# Altium footprint library Derogarian_Library.PcbLib: 99 footprints (part 6 of 7)
Each footprint in its own frame and in the unit in brackets; x right, y up, seen from the top. Pads: shape width x height; smd on the part's side, far side on the other; paste and mask are expansions set on the pad; w line width, h text height; cw(c..) or ccw(c..) is an arc to the next point about the centre after c.
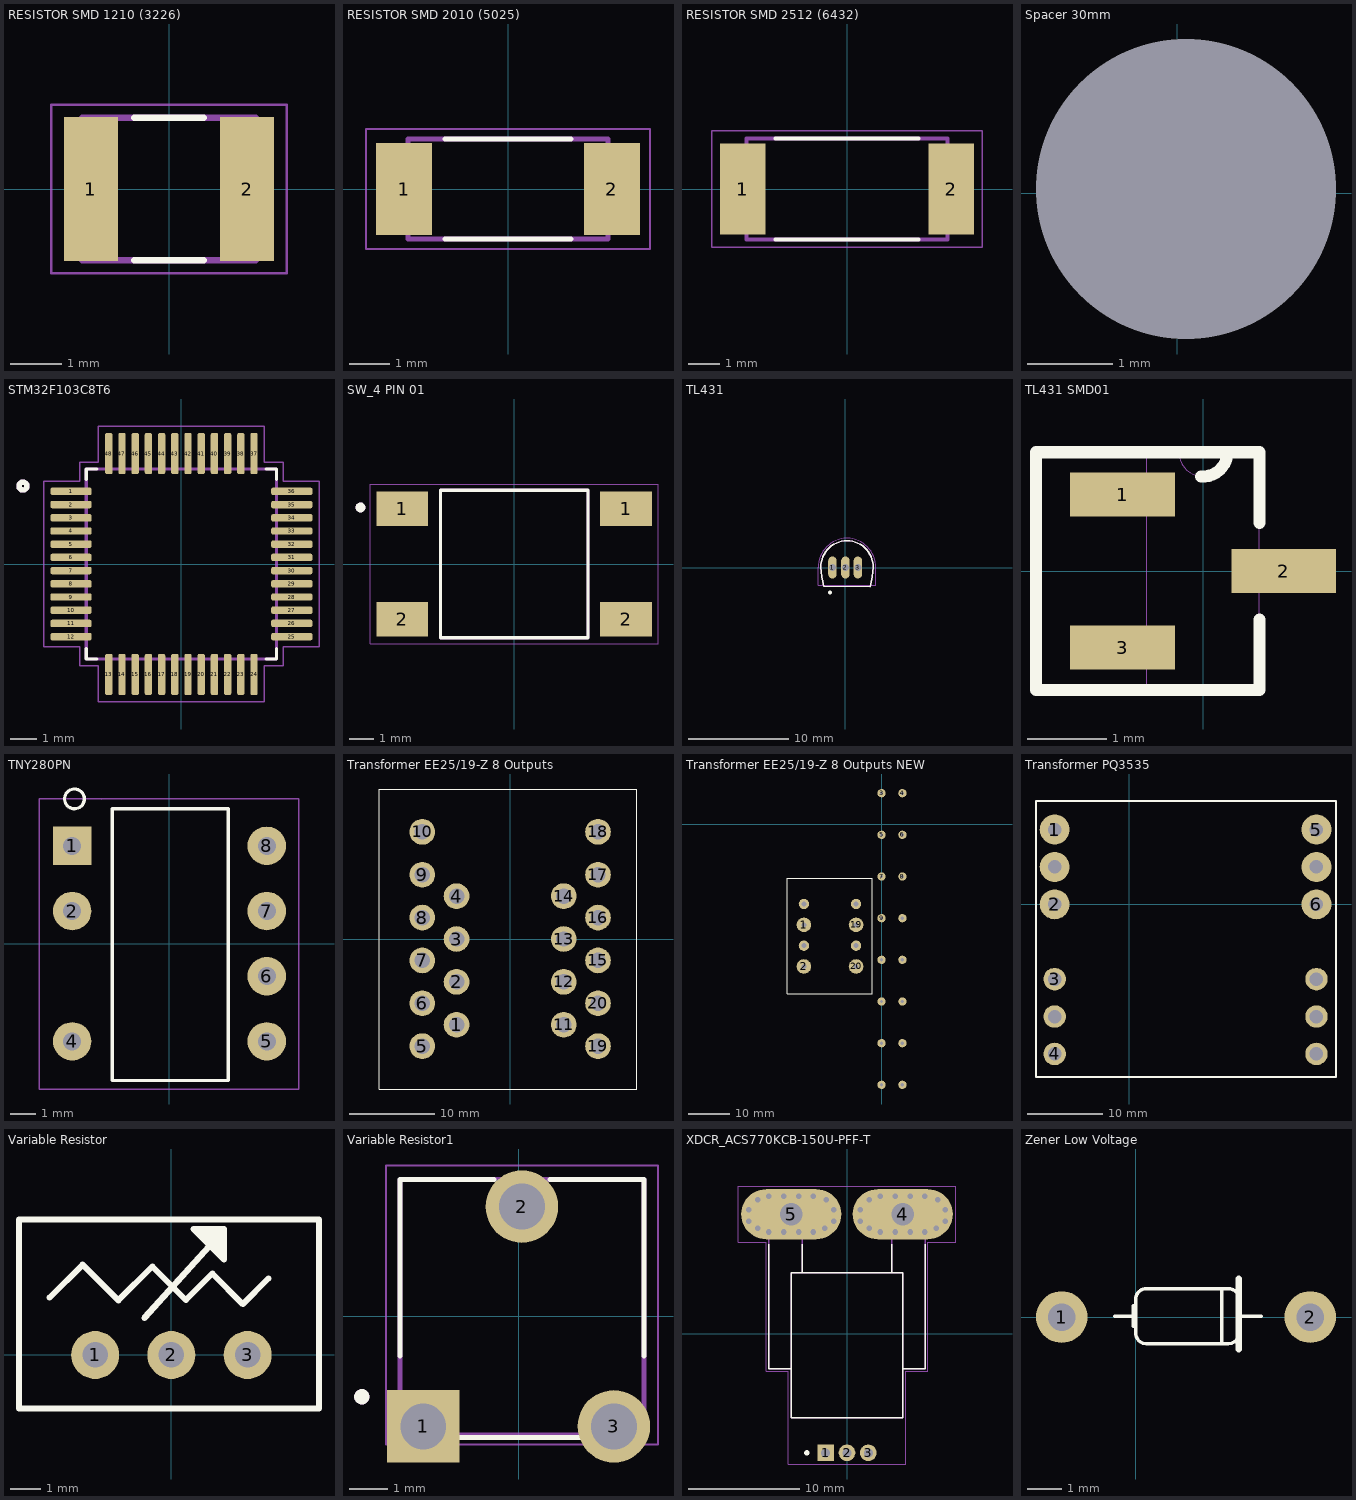
[diagram p5: the footprints below, top view; thin cyan lines are the x and y axes]

## RESISTOR SMD 1210 (3226) [mm] "SMD 1210"
pads (2):
  rect 1.06x2.82 smd: 1(-1.528,0) 2(1.528,0)
Top Overlay:
  lines w0.127: -0.68,-1.4 0.68,-1.4 ; -0.68,1.4 0.68,1.4
Mechanical 13:
  lines w0.127: -1.7,-1.4 -1.7,1.4 1.7,1.4 1.7,-1.4 -1.7,-1.4
Mechanical 15:
  lines w0.05: -2.308,-1.65 -2.308,1.65 2.308,1.65 2.308,-1.65 -2.308,-1.65
3D body "User Library-RESC3225X06N.STEP": height 0.55, standoff 0, extent -1.625,-1.199 1.575,1.301

## RESISTOR SMD 2010 (5025) [mm] "SMD 2010"
pads (2):
  rect 1.4x2.3 smd: 1(-2.6,0) 2(2.6,0)
Top Overlay:
  lines w0.127: -1.58,-1.25 1.58,-1.25 ; -1.58,1.25 1.58,1.25
Mechanical 13:
  lines w0.127: -2.5,-1.25 2.5,-1.25 2.5,1.25 -2.5,1.25 -2.5,-1.25
Mechanical 15:
  lines w0.05: -3.55,-1.5 3.55,-1.5 3.55,1.5 -3.55,1.5 -3.55,-1.5
3D body "User Library-R2010-2.STEP": height 0.6, standoff 0, extent -2.449,-1.245 2.551,1.255

## RESISTOR SMD 2512 (6432) [mm] "SMD 2512"
pads (2):
  rect 1.45x2.9 smd: 1(-3.325,0) 2(3.325,0)
Top Overlay:
  lines w0.127: -2.28,-1.6 2.28,-1.6 ; -2.28,1.6 2.28,1.6
Mechanical 13:
  lines w0.127: -3.2,-1.6 3.2,-1.6 3.2,1.6 -3.2,1.6 -3.2,-1.6
Mechanical 15:
  lines w0.05: -4.3,-1.85 4.3,-1.85 4.3,1.85 -4.3,1.85 -4.3,-1.85
3D body "User Library-RESC6432X06.STEP": height 0.6, standoff 0, extent -3.225,-1.6 3.175,1.6

## Spacer 30mm [mil]
pads (1):
  round 0 hole 137.8: ""(4,2)
3D body "DSMM3050030_BUFAB.step": height 393.7, standoff -1181.1, extent -98.85,-125 98,102.3

## STM32F103C8T6 [mm] "ARM® Cortex®-M3 STM32F1 Microcontroller IC 32-Bit 72MHz 64KB"
pads (48):
  rrect50% 1.56x0.28 smd: 1(-4.18,2.75) 2(-4.18,2.25) 3(-4.18,1.75) 4(-4.18,1.25) 5(-4.18,0.75) 6(-4.18,0.25) 7(-4.18,-0.25) 8(-4.18,-0.75) 9(-4.18,-1.25) 10(-4.18,-1.75) 11(-4.18,-2.25) 12(-4.18,-2.75) 25(4.18,-2.75) 26(4.18,-2.25) 27(4.18,-1.75) 28(4.18,-1.25) 29(4.18,-0.75) 30(4.18,-0.25) 31(4.18,0.25) 32(4.18,0.75) 33(4.18,1.25) 34(4.18,1.75) 35(4.18,2.25) 36(4.18,2.75)
  rrect50% 0.28x1.56 smd: 13(-2.75,-4.18) 14(-2.25,-4.18) 15(-1.75,-4.18) 16(-1.25,-4.18) 17(-0.75,-4.18) 18(-0.25,-4.18) 19(0.25,-4.18) 20(0.75,-4.18) 21(1.25,-4.18) 22(1.75,-4.18) 23(2.25,-4.18) 24(2.75,-4.18) 37(2.75,4.18) 38(2.25,4.18) 39(1.75,4.18) 40(1.25,4.18) 41(0.75,4.18) 42(0.25,4.18) 43(-0.25,4.18) 44(-0.75,4.18) 45(-1.25,4.18) 46(-1.75,4.18) 47(-2.25,4.18) 48(-2.75,4.18)
Top Overlay:
  circle w0.2: c-6,2.95 r0.15
  lines w0.127: -3.6,-3.21 -3.6,-3.6 -3.21,-3.6 ; -3.6,3.21 -3.6,3.6 -3.21,3.6 ; 3.21,-3.6 3.6,-3.6 3.6,-3.21 ; 3.21,3.6 3.6,3.6 3.6,3.21
Mechanical 13:
  circle w0.2: c-6,2.95 r0.15
  lines w0.127: -3.6,-3.6 -3.6,3.6 3.6,3.6 3.6,-3.6 -3.6,-3.6
Mechanical 15:
  lines w0.05: -5.21,-3.14 -5.21,3.14 -3.85,3.14 -3.85,3.85 -3.14,3.85 -3.14,5.21 3.14,5.21 3.14,3.85 3.85,3.85 3.85,3.14 5.21,3.14 5.21,-3.14 3.85,-3.14 3.85,-3.85 3.14,-3.85 3.14,-5.21 -3.14,-5.21 -3.14,-3.85 -3.85,-3.85 -3.85,-3.14 -5.21,-3.14
3D body "User Library-LQFP50P900X900X160.STEP": height 1.6, standoff 0, extent -4.5,-4.5 4.5,4.5

## SW_4 PIN 01 [mm]
pads (4):
  rect 2.1x1.4 smd: 1(-4.55,2.25) 1(4.55,2.25) 2(-4.55,-2.25) 2(4.55,-2.25)
Top Overlay:
  circle w0.2: c-6.25,2.3 r0.1
  lines w0.127: -3,-3 -3,3 3,3 3,-3 -3,-3
Mechanical 13:
  circle w0.2: c-6.25,2.3 r0.1
  lines w0.127: -3,-3 3,-3 3,3 -3,3 -3,-3
Mechanical 15:
  lines w0.05: -5.85,-3.25 5.85,-3.25 5.85,3.25 -5.85,3.25 -5.85,-3.25
3D body "4-1437565-2.stp": height 5, standoff -0.07, extent -5.178,-3.15 4.822,2.85

## TL431 [mm] "Voltage Reference"
pads (3):
  oval 0.85x2.2 hole 0.7: 1(-1.27,0) 2(0.025,0) 3(1.27,0)
Top Overlay:
  circle w0.2: c-1.524,-2.489 r0.1
  lines w0.127: -2.428,0.043 ccw(c6.356,0.349) -2.152,-1.859 ; -2.427,-0.004 cw(c0.21,0.042) 0.164,2.679 ; -2.134,-1.892 2.489,-1.905 ; 0.191,2.679 cw(c0.145,0.042) 2.783,-0.004 ; 2.497,-1.9 ccw(c-6,0.349) 2.784,0.043
Mechanical 13:
  lines w0.127: -2.428,0.043 ccw(c6.356,0.349) -2.152,-1.859 ; -2.427,-0.004 cw(c0.21,0.042) 0.164,2.679 ; -2.108,-1.892 2.464,-1.905 ; 0.191,2.679 cw(c0.145,0.042) 2.783,-0.004 ; 2.501,-1.883 ccw(c-6,0.349) 2.784,0.043
Mechanical 15:
  lines w0.05: -2.677,-0.009 cw(c0.21,0.042) 0.16,2.929 ; -2.677,0.009 -2.677,-1.761 3.033,-1.761 3.033,0.009 ; 0.196,2.929 cw(c0.145,0.042) 3.033,-0.009
3D body "step_temp.STEP": height 7.84, standoff -10.2, extent -2.412,-1.369 2.413,2.311

## TL431 SMD01 [mil]
pads (3):
  rect 52x22 smd: 1(-40,38) 2(40,0) 3(-40,-38)
Top Overlay:
  lines w6: -1.04,47 ccw(c0,58.96) 12,58.96 ; 28,-24 28,-59 -83,-59 -83,59 12,59 28,59 28,24
Mechanical 13:
  lines w0: -28,-48 -49,-48 -49,-28 -28,-28 ; -28,-48 -28,-28 ; -28,-48 -28,-59 28,-59 28,-10 ; -28,-28 -28,28 ; -28,28 -49,28 -49,48 -28,48 ; -28,28 -28,48 ; -28,48 -28,59 -12,59 ; -12,59 ccw(c0,59) 12,59 ; -12,59 12,59 ; 12,59 28,59 28,10 ; 28,-10 49,-10 49,10 28,10 ; 28,-10 28,10
3D body "step_temp.STEP": height 47.24, standoff -3.94, extent -52.36,-59.84 50,59.84

## TNY280PN [mm] "IC OFFLINE SWITCH FLYBACK 8DIP"
pads (7):
  rect 1.5x1.5 hole 0.7: 1(-3.793,3.81)
  round 1.5 hole 0.7: 2(-3.793,1.27) 4(-3.793,-3.81) 5(3.793,-3.81) 6(3.793,-1.27) 7(3.793,1.27) 8(3.793,3.81)
Top Overlay:
  circle w0.127: c-3.7,5.639 r0.386
  lines w0.127: 2.269,-5.334 -2.227,-5.334 -2.227,5.258 2.294,5.258 2.294,-5.334
Mechanical 15:
  lines w0.05: -2.674,5.623 -2.659,5.639 ; -5.072,-5.664 -5.072,5.639 5.037,5.639 5.037,-5.664 -5.072,-5.664
3D body "User Library-DIP-8 for TNY-1.STEP": height 4.36, standoff -3, extent -3.978,-4.674 3.892,4.726

## Transformer EE25/19-Z 8 Outputs [mm]
pads (20):
  round 3 hole 1.8: 1(-6.25,-10) 2(-6.25,-5) 3(-6.25,0) 4(-6.25,5) 5(-10.25,-12.5) 6(-10.25,-7.5) 7(-10.25,-2.5) 8(-10.25,2.5) 9(-10.25,7.5) 10(-10.25,12.5) 11(6.25,-10) 12(6.25,-5) 13(6.25,0) 14(6.25,5) 15(10.25,-2.5) 16(10.25,2.5) 17(10.25,7.5) 18(10.25,12.5) 19(10.25,-12.5) 20(10.25,-7.5)
Top Overlay:
  lines w0.1: -15.25,-17.5 -15.25,17.5 ; 14.75,-17.5 14.75,17.5
  lines w0.127: -15.25,-17.5 14.75,-17.5 ; -15.25,17.5 14.75,17.5
3D body "70373408.stp": height 7.32, standoff -11.73, extent -13.462,-14.859 -7.112,15.371
3D body "70373408.stp": height 7.32, standoff -11.73, extent 7.366,-15.117 13.716,15.113
3D body "User Library-POL-24208.STEP": height 21, standoff -5.5, extent -9.236,-15.64 9.564,10.36

## Transformer EE25/19-Z 8 Outputs NEW [mm]
pads (24):
  round 3.5 hole 1.2: 1(-18.63,-24.098) 2(-18.63,-34.098) 19(-6.13,-24.098) 20(-6.13,-34.098)
  round 2 hole 0.8: 3(0,7.5) 4(5,7.5) 5(0,-2.5) 6(5,-2.5) 7(0,-12.5) 8(5,-12.5) 9(0,-22.5) 10(5,-22.5) 11(0,-32.5) 12(5,-32.5) 13(0,-42.5) 14(5,-42.5) 15(0,-52.5) 16(5,-52.5) 17(0,-62.5) 18(5,-62.5)
  round 2.5 hole 1.2: ""(-18.63,-29.098) ""(-18.63,-19.098) ""(-6.13,-29.098) ""(-6.13,-19.098)
Top Overlay:
  lines w0.1: -22.6,-40.622 -22.6,-12.972 ; -2.2,-40.622 -2.2,-12.972
  lines w0.127: -22.6,-40.622 -2.2,-40.622 ; -22.6,-12.972 -2.2,-12.972
3D body "User Library-POL-24208.STEP": height 21, standoff -5.5, extent -21.616,-39.738 -2.816,-13.738

## Transformer PQ3535 [mm]
pads (12):
  round 4 hole 1.8: 1(-10,10) 2(-10,0) 5(25,10) 6(25,0) ""(-10,5) ""(25,5)
  round 3 hole 1.8: 3(-10,-10) 4(-10,-20) ""(-10,-15) ""(25,-20) ""(25,-15) ""(25,-10)
Top Overlay:
  lines w0.3: -12.497,-23.089 -12.497,13.818 27.61,13.818 27.61,-23.089 -12.497,-23.089
3D body "User Library-PQ3535.STEP": height 5, standoff -35, extent -12.032,-22.655 26.968,12.445

## Variable Resistor [mm] "Through Hole Trimmer Potentiometer Turn Top Adjustment"
height 1.524
pads (3):
  round 1.6 hole 0.85: 1(-2.54,0) 2(0,0) 3(2.54,0)
Top Overlay:
  lines w0.2: -4.064,1.908 -2.959,3.013 -1.765,1.819 -0.635,2.95 0.483,1.832 1.365,2.715 2.383,1.697 3.238,2.553 ; -0.898,1.241 1.27,3.628 1.27,4.194 ; 1.016,4.115 1.648,3.482 1.484,4.023 1.484,3.621 1.397,3.534 1.397,4.194 ; 1.335,3.608 1.601,3.874 ; 1.471,3.922 1.738,4.189 ; 1.492,3.854 1.753,4.115 1.753,3.178 0.737,4.194 1.753,4.194 1.753,3.902 1.486,3.635 1.486,3.585 1.753,3.318 ; 1.695,3.756 1.695,3.439 1.708,3.451 1.708,3.362 1.753,3.407 1.753,3.813 ; -5.08,-1.789 -5.08,4.521 4.92,4.521 4.92,-1.789 -5.08,-1.789
3D body "User Library-3299W-1-103RLF.STEP": height 12.56, standoff -5.22, extent -4.763,-1.905 4.762,4.191

## Variable Resistor1 [mm] "Through Hole Trimmer Potentiometer Turn Top Adjustment"
pads (3):
  rect 1.9x1.9 hole 1.2: 1(-2.502,-2.883)
  round 1.9 hole 1.2: 2(0.089,2.883) 3(2.502,-2.883)
Top Overlay:
  circle w0.2: c-4.111,-2.106 r0.1
  lines w0.127: -3.111,-3.176 3.289,-3.176 ; -3.111,-1.036 -3.111,3.594 -0.641,3.594 ; 0.819,3.594 3.289,3.594 3.289,-1.036
Mechanical 13:
  circle w0.2: c-4.111,-2.106 r0.1
  lines w0.127: -3.111,-3.106 3.289,-3.106 3.289,3.594 -3.111,3.594 -3.111,-3.106
Mechanical 15:
  lines w0.05: -3.481,-3.356 3.659,-3.356 3.659,3.964 -3.481,3.964 -3.481,-3.356
3D body "User Library-Trimmer, 3306F-1.STEP": height 7.62, standoff -3.04, extent -3.468,-4.89 3.342,3.362

## XDCR_ACS770KCB-150U-PFF-T [mm]
pads (37):
  rect 1.5x1.5 hole 0.8: 1(-1.91,-10.7)
  round 1.5 hole 0.8: 2(0,-10.7) 3(1.91,-10.7)
  oval 9x4.5 hole 2: 4(5,10.7) 5(-5,10.7)
  round 0.8 hole 0.5: 4_1(3,9.1) 4_2(4.33,9.1) 4_3(5.66,9.1) 4_4(6.99,9.1) 4_5(8,9.43) 4_6(8.8,10.05) 4_7(8.8,11.1) 4_8(8.15,12) 4_9(6.99,12.3) 4_10(5.66,12.3) 4_11(4.33,12.3) 4_12(3,12.3) 4_13(2,12) 4_14(1.2,11.1) 4_15(1.2,10.05) 4_16(2,9.43) 5_1(-7,9.1) 5_2(-5.67,9.1) 5_3(-4.34,9.1) 5_4(-3.01,9.1) 5_5(-8,9.43) 5_6(-8.8,10.05) 5_7(-8.8,11.1) 5_8(-8,12) 5_9(-7,12.3) 5_10(-5.67,12.3) 5_11(-4.34,12.3) 5_12(-3.01,12.3) 5_13(-1.85,12) 5_14(-1.2,11.1) 5_15(-1.2,10.05) 5_16(-2,9.43)
Top Overlay:
  circle w0.24: c-3.6,-10.7 r0.12
  lines w0.127: -7,8 -7,-3.15 -5,-3.15 ; -4,8 -4,5.45 ; 4,8 4,5.45 ; 7,8 7,-3.15 5,-3.15 ; -5,-3.15 -5,5.45 -4,5.45 ; -5,-3.15 -5,-7.55 5,-7.55 5,-3.15 ; -4,5.45 4,5.45 ; 4,5.45 5,5.45 5,-3.15
Mechanical 1:
  lines w0: -5,11.7 -4.95,11.7 ; 5,11.7 5.05,11.7 ; -7,9.7 cw(c-7,10.7) -7,11.7 -3,11.7 cw(c-3,10.7) -3,9.7 -7,9.7 ; 3,9.7 cw(c3,10.7) 3,11.7 7,11.7 cw(c7,10.7) 7,9.7 3,9.7
Mechanical 13:
  lines w0.127: -5,-3.15 -7,-3.15 -7,11.45 -4,11.45 -4,5.45 ; -5,-3.15 -5,5.45 -4,5.45 ; -5,-3.15 -5,-7.55 5,-7.55 5,-3.15 ; -4,5.45 4,5.45 ; 4,5.45 4,11.45 7,11.45 7,-3.15 5,-3.15 ; 4,5.45 5,5.45 5,-3.15
Mechanical 15:
  lines w0.05: -9.75,8.2 -9.75,13.2 9.75,13.2 9.75,8.2 7.25,8.2 7.25,-3.4 5.25,-3.4 5.25,-11.7 -5.25,-11.7 -5.25,-3.4 -7.25,-3.4 -7.25,8.2 -9.75,8.2
3D body "ACS758LCB-100B-PFF-T--3DModel-STEP-56544.STEP": height 8, standoff -3.7, extent -7.127,-11.179 6.873,11.424

## Zener Low Voltage [mm] "Zener Diode"
pads (2):
  round 1.5 hole 0.8: 1(-2.159,0) 2(5.08,0)
Top Overlay:
  lines w0.1: -0.61,0.025 -0.101,0.025 ; -0.074,-0.275 -0.074,0.325 ; 3.658,0.025 2.999,0.025 ; 2.499,-0.775 2.499,0.825 ; 2.499,-0.775 0.299,-0.775 cw(c0.299,-0.475) -0.001,-0.475 -0.001,0.525 cw(c0.299,0.525) 0.299,0.825 2.499,0.825 ; 2.499,-0.775 2.699,-0.775 ccw(c2.699,-0.475) 2.999,-0.475 2.999,0.025 ; 2.499,0.825 2.699,0.825 cw(c2.699,0.525) 2.999,0.525 2.999,0.025
  lines w0.2: 2.995,-0.94 2.995,1.118
3D body "User Library-Diodo 1N914 (Pitch 280mils).STEP": height 1.84, standoff -2.82, extent -2.464,-0.686 5.264,0.991